# Altium footprint library Semicon-Discrete.pcblib: 205 footprints (part 3 of 13)
Each footprint in its own frame and in the unit in brackets; x right, y up, seen from the top. Pads: shape width x height; smd on the part's side, far side on the other; paste and mask are expansions set on the pad; w line width, h text height; cw(c..) or ccw(c..) is an arc to the next point about the centre after c.
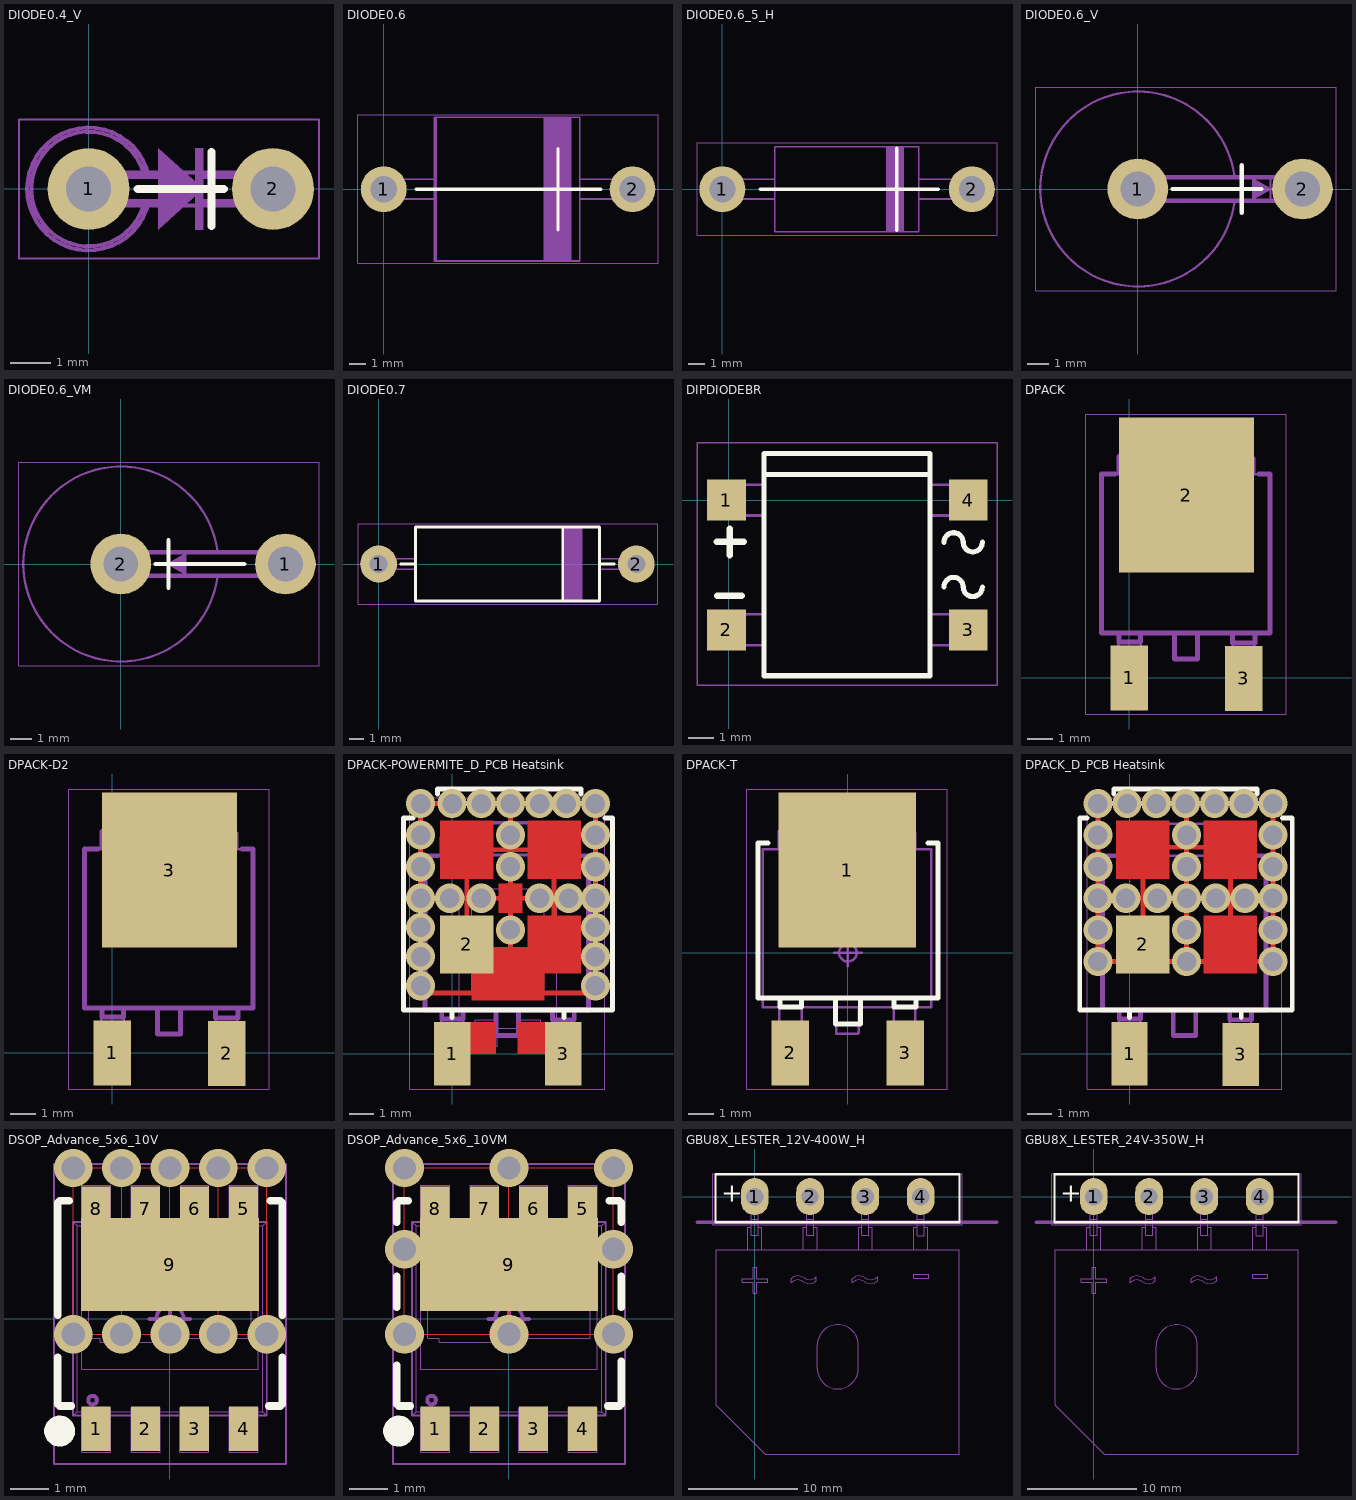
[diagram p2: the footprints below, top view; thin cyan lines are the x and y axes]

## DIODE0.4_V [mm]
pads (2):
  round 2 hole 1.1: 1(0,0) 2(4.5,0)
TopOverlay:
  lines w0.2: 1.2,0 3.3,0 ; 3,-0.9 3,0.9
2-TopCompOutl:
  lines w0.1: 1.338,-0.412 cw(c0,0) 1.338,0.412 ; 0,-0.4 4.5,-0.4 4.5,0.4 0,0.4 0,-0.4
4-TopCourty:
  circle w0.1: c0,0 r0.35
  lines w0.05: -1.7,-1.7 -1.7,1.7 5.625,1.7 5.625,-1.7 -1.7,-1.7
  lines w0.1: -0.525,0 0.525,0 ; 0,-0.525 0,0.525
7-TopAssy:
  rectangle: 2.6,-1 2.8,1
  region: 1.7,1 1.7,0 2.8,0
  region: 1.7,-1 1.7,0 2.8,0
  lines w0.1: 1.467,-0.314 cw(c0,0) 1.471,0.294 ; 1.7,-0.3 0,-0.3 cw(c0,0) 0,0.3 1.7,0.3 ; 2.8,-0.3 4.5,-0.3 ccw(c4.5,0) 4.5,0.3 2.8,0.3
  text ".Designator" at 1.175,1.275 h2.2

## DIODE0.6 [mm]
pads (2):
  round 2.8 hole 1.6: 1(0,0) 2(15.24,0)
TopOverlay:
  lines w0.2: 2,0 6.5,0 13.3,0 ; 10.675,-2.5 10.675,2.5
2-TopCompOutl:
  lines w0.1: 3.2,-0.6 0,-0.6 0,0.6 3.2,0.6 ; 10.8,-4.4 10.8,4.4 ; 12,-0.6 15.2,-0.6 15.2,0.6 12,0.6 ; 3.2,-4.4 3.2,4.4 12,4.4 12,-4.4 3.2,-4.4
4-TopCourty:
  circle w0.1: c0,0 r0.35
  lines w0.05: -1.575,-4.55 16.8,-4.55 16.8,4.575 -1.575,4.575 -1.575,-4.55
  lines w0.1: -0.525,0 0.525,0 ; 0,-0.525 0,0.525
7-TopAssy:
  rectangle: 9.8,-4.4 11.5,4.4
  lines w0.1: 3.1,-0.6 3.1,0.6 ; 3.1,-0.6 0,-0.6 0,0 0,0.6 3.1,0.6 ; 3.1,-0.6 3.1,-4.4 12,-4.4 12,-0.6 ; 3.1,0.6 3.1,4.4 12,4.4 12,0.6 ; 12,-0.6 12,0.6 ; 12,-0.6 15.3,-0.6 15.3,0 15.3,0.6 12,0.6
  text ".Designator" at 3.8,-0.5 h2.2
3D body "DIODE0.6.STEP": height 8.81, standoff -2.54, extent -0.55,-4.4 15.757,4.325

## DIODE0.6_5_H [mm]
height 5
pads (2):
  round 2.8 hole 1.6: 1(0,0) 2(15.24,0)
TopOverlay:
  lines w0.2: 2.3,0 13.2,0 ; 10.65,-2.5 10.65,2.5
2-TopCompOutl:
  lines w0.1: 3.2,-0.6 0,-0.6 0,0.6 3.2,0.6 ; 10.8,-2.6 10.8,2.6 ; 12,-0.6 15.2,-0.6 15.2,0.6 12,0.6 ; 3.2,-2.6 3.2,2.6 12,2.6 12,-2.6 3.2,-2.6
4-TopCourty:
  circle w0.1: c0,0 r0.35
  lines w0.05: -1.55,-2.8 -1.55,2.825 16.775,2.825 16.775,-2.8 -1.55,-2.8
  lines w0.1: -0.525,0 0.525,0 ; 0,-0.525 0,0.525
7-TopAssy:
  rectangle: 10,-2.6 11.1,2.6
  lines w0.1: 3.2,-0.6 0,-0.6 cw(c0,0) 0,0.6 3.2,0.6 ; 12,-0.6 15.2,-0.6 ccw(c15.2,0) 15.2,0.6 12,0.6 ; 3.2,-2.6 3.2,2.6 12,2.6 12,-2.6 3.2,-2.6
  text ".Designator" at 3.775,-0.525 h2.2

## DIODE0.6_V [mm]
pads (2):
  round 2.8 hole 1.6: 1(0,0) 2(7.6,0)
TopOverlay:
  lines w0.2: 1.6,0 5.7,0 ; 4.8,-1.1 4.8,1.1
2-TopCompOutl:
  lines w0.1: 4.472,-0.497 cw(c0,0) 4.472,0.497 ; 0,-0.5 7.6,-0.5 7.6,0.5 0,0.5 0,-0.5
4-TopCourty:
  circle w0.1: c0,0 r0.35
  lines w0.05: -4.7,-4.7 -4.7,4.7 9.15,4.7 9.15,-4.7 -4.7,-4.7
  lines w0.1: -0.525,0 0.525,0 ; 0,-0.525 0,0.525
7-TopAssy:
  region: 5.325,0.45 6.1,0 5.325,-0.45
  lines w0.1: 4.456,-0.626 cw(c0,0) 4.456,0.626 ; 4.5,0 6.575,0 ; 6.125,-0.475 6.125,0.475 ; 7.625,0.6 cw(c7.625,0) 7.625,-0.6 0,-0.6 cw(c0,0) 0,0.6 7.65,0.6 ; 5.325,-0.45 6.125,0 5.325,0.45 5.325,-0.45
  text ".Designator" at -2.55,1.4 h2.2

## DIODE0.6_VM [mm]
pads (2):
  round 2.8 hole 1.6: 1(7.6,0) 2(0,0)
TopOverlay:
  lines w0.2: 1.6,0 5.7,0 ; 2.2,-1.1 2.2,1.1
2-TopCompOutl:
  lines w0.1: 4.472,-0.497 cw(c0,0) 4.472,0.497 ; 0,-0.5 0,0.5 7.6,0.5 7.6,-0.5 0,-0.5
4-TopCourty:
  circle w0.1: c0,0 r0.35
  lines w0.05: -4.7,-4.7 9.15,-4.7 9.15,4.7 -4.7,4.7 -4.7,-4.7
  lines w0.1: -0.525,0 0.525,0 ; 0,-0.525 0,0.525
7-TopAssy:
  region: 2.975,-0.45 2.2,0 2.975,0.45
  lines w0.1: 1.725,0 3.8,0 ; 2.175,-0.475 2.175,0.475 ; 4.456,-0.626 cw(c0,0) 4.456,0.626 ; 7.625,0.6 cw(c7.625,0) 7.625,-0.6 0,-0.6 cw(c0,0) 0,0.6 7.65,0.6 ; 2.175,0 2.975,-0.45 2.975,0.45 2.175,0
  text ".Designator" at -2.4,1.575 h2.2

## DIODE0.7 [mm]
pads (2):
  round 2.54 hole 1.25: 1(0,0) 2(17.78,0)
TopOverlay:
  lines w0.2: 1.524,0 2.54,0 ; 12.7,-2.54 12.7,2.54 ; 15.24,0 16.256,0 ; 2.54,-2.54 2.54,2.54 15.24,2.54 15.24,-2.54 2.54,-2.54
4-TopCourty:
  circle w0.1: c0,0 r0.35
  lines w0.05: -1.425,-2.775 19.275,-2.775 19.275,2.775 -1.425,2.775 -1.425,-2.775
  lines w0.1: -0.525,0 0.525,0 ; 0,-0.525 0,0.525
7-TopAssy:
  rectangle: 12.8,-2.55 14.075,2.525
  lines w0.1: 2.55,-0.35 0,-0.35 cw(c0,0) 0,0.35 2.55,0.35 ; 15.225,-0.35 17.775,-0.35 ccw(c17.775,0) 17.775,0.35 15.225,0.35 ; 2.55,-2.525 15.225,-2.525 15.225,2.525 2.55,2.525 2.55,-2.525
  text ".Designator" at 3.05,-0.75 h2.2

## DIPDIODEBR [mm] "DIP,DiodeBridge"
height 3
pads (4):
  rect 1.52x1.6 smd: 1(-0.1,0) 2(-0.1,-5.08) 3(9.371,-5.08) 4(9.371,0)
TopOverlay:
  lines w0.2: 1.375,1 7.875,1 ; 8.425,-3.4 cw(c8.801,-3.4) 9.177,-3.4 ccw(c9.551,-3.4) 9.925,-3.4 ; 8.425,-1.65 cw(c8.801,-1.65) 9.177,-1.65 ccw(c9.551,-1.65) 9.925,-1.65 ; 1.375,-6.875 7.875,-6.875 7.875,1.825 1.375,1.825 1.375,-6.875
  lines w0.254: -0.475,-1.625 0.575,-1.625 ; -0.45,-3.75 0.5,-3.75 ; 0.025,-2.15 0.025,-1.125
2-TopCompOutl:
  lines w0.1: 1.375,-5.675 0,-5.675 0,-4.475 1.375,-4.475 ; 1.375,-0.6 0,-0.6 0,0.6 1.375,0.6 ; 1.375,1 7.87,1 ; 7.875,-5.675 9.25,-5.675 9.25,-4.475 7.875,-4.475 ; 7.875,-0.6 9.25,-0.6 9.25,0.6 7.875,0.6 ; 1.37,-6.9 7.875,-6.9 7.875,1.795 ccw(c7.87,1.795) 7.87,1.8 1.375,1.8 1.37,-6.9
4-TopCourty:
  circle w0.1: c0,0 r0.35
  lines w0.05: -1.25,-7.25 -1.25,2.25 10.5,2.25 10.5,-7.25 -1.25,-7.25
  lines w0.1: -0.525,0 0.525,0 ; 0,-0.525 0,0.525
7-TopAssy:
  lines w0.1: 1.375,-5.675 0,-5.675 0,-4.475 1.375,-4.475 ; 1.375,-0.6 0,-0.6 0,0.6 1.375,0.6 ; 1.375,1 7.87,1 ; 7.875,-5.675 9.25,-5.675 9.25,-4.475 7.875,-4.475 ; 7.875,-0.6 9.25,-0.6 9.25,0.6 7.875,0.6 ; 1.37,-6.9 7.875,-6.9 7.875,1.795 ccw(c7.87,1.795) 7.87,1.8 1.375,1.8 1.37,-6.9
  text ".Designator" at 5,-5.175 h2.2

## DPACK [mm]
pads (3):
  rect 1.5x2.6 smd: 1(0,0) 3(4.575,-0.025)
  rect 5.4x6.2 smd: 2(2.275,7.3)
2-TopCompOutl:
  lines w0.05: -0.5,8.15 -0.475,8.15 -0.475,8.85 0.15,9.475 4.3,9.475 5,8.775 5,8.15 ; -0.425,1.825 -0.45,1.825 -0.45,-0.5 0.45,-0.5 0.45,1.825 4.125,1.825 4.125,-0.5 5,-0.5 5,1.825 ; 1.825,1.825 1.825,0.775 1.85,0.75 2.675,0.75 2.725,0.8 2.725,1.825 ; -1.1,1.825 -1.1,8.15 5.625,8.15 5.625,1.825 -1.1,1.825
4-TopCourty:
  circle w0.05: c0,0 r0.3
  lines w0.05: -0.45,0 0.45,0 ; 0,-0.45 0,0.45 ; -1.75,-1.45 6.275,-1.45 6.275,10.55 5.55,10.55 -1.75,10.55 -1.75,-1.45
7-TopAssy:
  lines w0.1: -0.5,8.15 -0.475,8.15 -0.475,8.85 0.15,9.475 4.3,9.475 5,8.775 5,8.15 ; 1.825,1.825 1.825,0.775 1.85,0.75 2.675,0.75 2.725,0.8 2.725,1.825 ; 5,1.825 5,-0.5 4.125,-0.5 4.125,1.825 0.45,1.825 0.45,-0.5 -0.45,-0.5 -0.45,1.825 ; -0.45,1.825 -0.425,1.825 ; -0.45,1.825 -0.425,1.825 ; -0.45,1.825 -0.425,1.825 ; -1.1,1.825 5.625,1.825 5.625,8.15 -1.1,8.15 -1.1,1.825
  text ".Designator" at 0.575,3.75 h2.2
13-SMDTopOverlay:
  lines w0.2: -0.575,8.15 -1.11,8.15 -1.11,1.8 5.62,1.8 ; -0.45,1.8 -0.425,1.8 -0.425,1.425 0.45,1.425 0.45,1.8 ; -0.44,1.8 -0.43,1.8 ; 1.85,1.8 1.8,1.8 1.8,0.75 2.725,0.75 2.725,1.8 ; 4.1,1.8 4.125,1.8 4.125,1.4 5.025,1.4 5.025,1.8 ; 5.175,8.15 5.62,8.15 5.62,1.81 5.63,1.81
3D body "DPACK.STEP": height 2, standoff 0, extent -1.1,-0.3 5.625,9.675

## DPACK-D2 [mm]
pads (3):
  rect 1.5x2.6 smd: 1(0,0) 2(4.575,-0.025)
  rect 5.4x6.2 smd: 3(2.275,7.3)
2-TopCompOutl:
  lines w0.05: -0.5,8.15 -0.475,8.15 -0.475,8.85 0.15,9.475 4.3,9.475 5,8.775 5,8.15 ; -0.425,1.825 -0.45,1.825 -0.45,-0.5 0.45,-0.5 0.45,1.825 4.125,1.825 4.125,-0.5 5,-0.5 5,1.825 ; 1.825,1.825 1.825,0.775 1.85,0.75 2.675,0.75 2.725,0.8 2.725,1.825 ; -1.1,1.825 5.625,1.825 5.625,8.15 -1.1,8.15 -1.1,1.825
4-TopCourty:
  circle w0.1: c0,0 r0.35
  lines w0.05: -1.75,-1.45 -1.75,10.55 5.55,10.55 6.275,10.55 6.275,-1.45 -1.75,-1.45
  lines w0.1: -0.525,0 0.525,0 ; 0,-0.525 0,0.525
7-TopAssy:
  lines w0.1: -0.5,8.15 -0.475,8.15 -0.475,8.85 0.15,9.475 4.3,9.475 5,8.775 5,8.15 ; 1.825,1.825 1.825,0.775 1.85,0.75 2.675,0.75 2.725,0.8 2.725,1.825 ; 5,1.825 5,-0.5 4.125,-0.5 4.125,1.825 0.45,1.825 0.45,-0.5 -0.45,-0.5 -0.45,1.825 ; -0.45,1.825 -0.425,1.825 ; -0.45,1.825 -0.425,1.825 ; -0.45,1.825 -0.425,1.825 ; -1.1,1.825 5.625,1.825 5.625,8.15 -1.1,8.15 -1.1,1.825
  text ".Designator" at -0.45,2.675 h2.2
13-SMDTopOverlay:
  lines w0.2: -0.575,8.15 -1.11,8.15 -1.11,1.8 5.62,1.8 ; -0.45,1.8 -0.425,1.8 -0.425,1.425 0.45,1.425 0.45,1.8 ; -0.44,1.8 -0.43,1.8 ; 1.85,1.8 1.8,1.8 1.8,0.75 2.725,0.75 2.725,1.8 ; 4.1,1.8 4.125,1.8 4.125,1.4 5.025,1.4 5.025,1.8 ; 5.175,8.15 5.62,8.15 5.62,1.81 5.63,1.81

## DPACK-POWERMITE_D_PCB Heatsink [mm]
height 4
pads (3):
  rect 1.5x2.6 smd: 1(0,0) 3(4.575,0)
  rect 2.2x2.4 smd: 2(0.6,4.5)
via 5.9,10.3 diameter 1.2 hole 0.8
via 3.6,10.3 diameter 1.2 hole 0.8
via 4.7,10.3 diameter 1.2 hole 0.8
via 0,10.3 diameter 1.2 hole 0.8
via 1.2,10.3 diameter 1.2 hole 0.8
via 4.8,6.4 diameter 1.2 hole 0.8
via 3.6,6.4 diameter 1.2 hole 0.8
via 1.2,6.4 diameter 1.2 hole 0.8
via -0.1,6.4 diameter 1.2 hole 0.8
via 2.4,10.3 diameter 1.2 hole 0.8
via 2.4,9 diameter 1.2 hole 0.8
via 2.4,7.7 diameter 1.2 hole 0.8
via 2.4,5.1 diameter 1.2 hole 0.8
via 5.9,9 diameter 1.2 hole 0.8
via 5.9,7.7 diameter 1.2 hole 0.8
via 5.9,6.4 diameter 1.2 hole 0.8
via 5.9,5.2 diameter 1.2 hole 0.8
via 5.9,4 diameter 1.2 hole 0.8
via 5.9,2.8 diameter 1.2 hole 0.8
via -1.3,2.8 diameter 1.2 hole 0.8
via -1.3,4 diameter 1.2 hole 0.8
via -1.3,5.2 diameter 1.2 hole 0.8
via -1.3,6.4 diameter 1.2 hole 0.8
via -1.3,7.7 diameter 1.2 hole 0.8
via -1.3,9 diameter 1.2 hole 0.8
via -1.3,10.3 diameter 1.2 hole 0.8
TopLayer:
  region: 5.3,5.7 3.1,5.7 3.1,3.3 5.3,3.3
  region: 5.3,9.6 3.1,9.6 3.1,7.2 5.3,7.2
  region: 1.7,9.6 -0.5,9.6 -0.5,7.2 1.7,7.2
  region: 3.1,4.4 1.6,4.4 1.6,3.3 3.1,3.3
  region: 2.9,7 1.9,7 1.9,5.8 2.9,5.8
  region: 1.8,1.3 0.55,1.3 0.55,0 1.8,0
  region: 3.9,1.3 2.7,1.3 2.7,0 3.9,0
  region: 3.8,3.325 0.8,3.325 0.8,2.2 3.8,2.2
  lines w0.2: -1.3,6.4 5.9,6.4 ; 0.6,4.5 0.6,8.4 4.2,8.4 4.2,4.5 ; 2.4,10.3 2.4,5.1 2.4,2.5 ; 2.4,2.5 0.1,2.5 -1.3,2.5 -1.3,10.3 5.9,10.3 5.9,2.5 2.4,2.5
TopOverlay:
  lines w0.2: -1.6,9.7 -2,9.7 -2,1.8 6.6,1.8 6.6,9.7 6.3,9.7 ; -0.6,10.7 -0.6,10.9 5.3,10.9 5.3,10.7 ; 0,1.5 0,1.7 ; 4.6,1.5 4.6,1.7
TopPaste:
  region: 5.4,5.8 3,5.8 3,3.2 5.4,3.2
  region: 5.4,9.7 3,9.7 3,7.1 5.4,7.1
  region: 1.8,9.7 -0.6,9.7 -0.6,7.1 1.8,7.1
  region: 3.1,4.5 1.6,4.5 1.6,3.2 3.1,3.2
  region: 3,7.1 1.8,7.1 1.8,5.7 3,5.7
  region: 1.9,1.4 0.5,1.4 0.5,-0.1 1.9,-0.1
  region: 4,1.4 2.6,1.4 2.6,-0.1 4,-0.1
  region: 3.9,3.325 0.7,3.325 0.7,2.1 3.9,2.1
TopSolder:
  rectangle: 3,7.1 5.4,9.7
  rectangle: 3,3.2 5.4,5.8
  rectangle: -0.6,7.1 1.8,9.7
  rectangle: 1.7,3.2 3.2,4.5
  rectangle: 1.8,5.7 3,7.1
  rectangle: 0.5,-0.075 1.9,1.4
  rectangle: 2.6,-0.1 4.1,1.4
  rectangle: 0.7,2.1 3.9,3.325
2-TopCompOutl:
  lines w0.05: -0.5,8.15 -0.475,8.15 -0.475,8.85 0.15,9.475 4.3,9.475 5,8.775 5,8.15 ; -0.425,1.825 -0.45,1.825 -0.45,-0.5 0.45,-0.5 0.45,1.825 4.125,1.825 4.125,-0.5 5,-0.5 5,1.825 ; 0.95,1.05 0.95,0.3 1.85,0.3 1.85,1.05 ; 1.4,6.4 1.4,6.8 3.2,6.8 3.2,6.4 ; 1.825,1.825 1.825,0.775 1.85,0.75 2.675,0.75 2.725,0.8 2.725,1.825 ; 2.75,1.05 2.75,0.3 3.65,0.3 3.65,1.05 ; -1.1,1.825 5.625,1.825 5.625,8.15 -1.1,8.15 -1.1,1.825 ; 0.3,1.05 0.3,6.4 4.3,6.4 4.3,1.05 0.3,1.05
4-TopCourty:
  circle w0.1: c0,0 r0.35
  lines w0.05: -1.75,-1.45 -1.75,10.55 5.55,10.55 6.275,10.55 6.275,-1.45 -1.75,-1.45
  lines w0.1: -0.525,0 0.525,0 ; 0,-0.525 0,0.525
5-MCadOutl:
  lines w0.05: 0.8,2.45 0.8,6 1.4,6 1.4,6.8 3.2,6.8 3.2,6 3.8,6 3.8,2.45 2.3,2.45 0.8,2.45 ; 0.95,0.3 0.95,1.4 1.85,1.4 1.85,0.3 0.95,0.3 ; 2.75,0.3 3.65,0.3 3.65,1.4 2.75,1.4 2.75,0.3
7-TopAssy:
  lines w0.1: -0.5,8.2 -0.475,8.2 -0.475,8.9 0.15,9.525 4.3,9.525 5,8.825 5,8.2 ; 1.825,1.875 1.825,0.825 1.85,0.8 2.675,0.8 2.725,0.85 2.725,1.875 ; 5,1.875 5,-0.45 4.125,-0.45 4.125,1.875 0.45,1.875 0.45,-0.45 -0.45,-0.45 -0.45,1.875 ; -0.45,1.875 -0.425,1.875 ; -0.45,1.875 -0.425,1.875 ; -0.45,1.875 -0.425,1.875 ; -1.1,1.875 5.625,1.875 5.625,8.2 -1.1,8.2 -1.1,1.875
  text ".Designator" at -0.15,3.35 h2.2
13-SMDTopOverlay:
  lines w0.2: -0.575,8.15 -1.11,8.15 -1.11,1.8 5.62,1.8 ; -0.45,1.8 -0.425,1.8 -0.425,1.425 0.45,1.425 0.45,1.8 ; -0.44,1.8 -0.43,1.8 ; 1.85,1.8 1.8,1.8 1.8,0.75 2.725,0.75 2.725,1.8 ; 4.1,1.8 4.125,1.8 4.125,1.4 5.025,1.4 5.025,1.8 ; 5.175,8.15 5.62,8.15 5.62,1.81 5.63,1.81

## DPACK-T [mm]
pads (3):
  rect 5.5x6.2 smd: 1(-0.025,3.3)
  rect 1.5x2.6 smd: 2(-2.3,-4) 3(2.3,-4)
TopOverlay:
  lines w0.2: -3.2,4.4 -3.6,4.4 -3.6,-1.8 0,-1.8 3.6,-1.8 3.6,4.4 3.2,4.4 ; -2.725,-1.8 -2.725,-2.175 -1.85,-2.175 -1.85,-1.8 ; -0.45,-1.8 -0.5,-1.8 -0.5,-2.85 0,-2.85 0.5,-2.85 0.5,-1.8 0.45,-1.8 ; 1.85,-1.8 1.85,-2.175 2.725,-2.175 2.725,-1.8
2-TopCompOutl:
  lines w0.05: -2.8,4.15 -2.775,4.15 -2.775,4.85 -2.15,5.475 2,5.475 2.7,4.775 2.7,4.15 ; -2.725,-2.175 -2.75,-2.175 -2.75,-4.5 -1.85,-4.5 -1.85,-2.175 1.825,-2.175 1.825,-4.5 2.7,-4.5 2.7,-2.175 ; -0.475,-2.175 -0.475,-3.225 -0.45,-3.25 0.375,-3.25 0.425,-3.2 0.425,-2.175 ; -3.4,-2.175 -3.4,4.15 3.325,4.15 3.325,-2.175 -3.4,-2.175
4-TopCourty:
  circle w0.1: c0,0 r0.35
  lines w0.05: -4.05,-5.45 -4.05,6.55 3.25,6.55 3.975,6.55 3.975,-5.45 -4.05,-5.45
  lines w0.1: -0.55,0 0.55,0 ; 0,-0.55 0,0.55
7-TopAssy:
  lines w0.1: -2.8,4.15 -2.775,4.15 -2.775,4.85 -2.15,5.475 2,5.475 2.7,4.775 2.7,4.15 ; -0.475,-2.175 -0.475,-3.225 -0.45,-3.25 0.375,-3.25 0.425,-3.2 0.425,-2.175 ; 2.7,-2.175 2.7,-4.5 1.825,-4.5 1.825,-2.175 -1.85,-2.175 -1.85,-4.5 -2.75,-4.5 -2.75,-2.175 ; -2.75,-2.175 -2.725,-2.175 ; -2.75,-2.175 -2.725,-2.175 ; -2.75,-2.175 -2.725,-2.175 ; -3.4,-2.175 -3.4,4.15 3.325,4.15 3.325,-2.175 -3.4,-2.175
  text ".Designator" at -2.5,-0.3 h2
3D body "DPACK-T.STEP": height 2, standoff 0, extent -3.4,-4.7 3.35,5.275

## DPACK_D_PCB Heatsink [mm]
height 4
pads (3):
  rect 1.5x2.6 smd: 1(0,0) 3(4.575,-0.025)
  rect 2.2x2.4 smd: 2(0.55,4.5)
via -1.3,10.3 diameter 1.2 hole 0.8
via -1.3,9 diameter 1.2 hole 0.8
via -1.3,7.7 diameter 1.2 hole 0.8
via -1.3,6.4 diameter 1.2 hole 0.8
via -1.3,5.1 diameter 1.2 hole 0.8
via -1.3,3.8 diameter 1.2 hole 0.8
via 5.9,3.8 diameter 1.2 hole 0.8
via 5.9,5.1 diameter 1.2 hole 0.8
via 5.9,6.4 diameter 1.2 hole 0.8
via 5.9,7.7 diameter 1.2 hole 0.8
via 5.9,9 diameter 1.2 hole 0.8
via 2.35,3.8 diameter 1.2 hole 0.8
via 2.35,5.1 diameter 1.2 hole 0.8
via 2.35,6.4 diameter 1.2 hole 0.8
via 2.35,7.7 diameter 1.2 hole 0.8
via 2.35,9 diameter 1.2 hole 0.8
via 2.3,10.3 diameter 1.2 hole 0.8
via -0.15,6.4 diameter 1.2 hole 0.8
via 1.15,6.4 diameter 1.2 hole 0.8
via 3.55,6.4 diameter 1.2 hole 0.8
via 4.75,6.4 diameter 1.2 hole 0.8
via 1.1,10.3 diameter 1.2 hole 0.8
via -0.1,10.3 diameter 1.2 hole 0.8
via 4.7,10.3 diameter 1.2 hole 0.8
via 3.5,10.3 diameter 1.2 hole 0.8
via 5.9,10.3 diameter 1.2 hole 0.8
TopLayer:
  region: 1.65,9.6 -0.55,9.6 -0.55,7.2 1.65,7.2
  region: 5.25,9.6 3.05,9.6 3.05,7.2 5.25,7.2
  region: 5.25,5.7 3.05,5.7 3.05,3.3 5.25,3.3
  lines w0.2: -1.3,6.4 5.9,6.4 ; 0.55,4.5 0.55,8.5 4.15,8.5 4.15,3.8 ; 2.35,3.8 2.35,10.3 ; -1.3,3.8 5.9,3.8 5.9,10.3 -1.3,10.3 -1.3,4.5 -1.3,3.8
TopOverlay:
  lines w0.2: -1.75,9.7 -2.05,9.7 -2.05,1.8 6.7,1.8 6.7,9.7 6.3,9.7 ; -0.65,10.7 -0.65,10.9 5.25,10.9 5.25,10.7 ; 0,1.5 0,1.7 ; 4.6,1.5 4.6,1.7
TopPaste:
  region: 1.75,9.7 -0.65,9.7 -0.65,7.1 1.75,7.1
  region: 5.35,9.7 2.95,9.7 2.95,7.1 5.35,7.1
  region: 5.35,5.8 2.95,5.8 2.95,3.2 5.35,3.2
TopSolder:
  rectangle: -0.65,7.1 1.65,9.7
  rectangle: 2.95,7.1 5.25,9.7
  rectangle: 2.95,3.2 5.25,5.8
2-TopCompOutl:
  lines w0.05: -0.55,8.15 -0.525,8.15 -0.525,8.85 0.1,9.475 4.25,9.475 4.95,8.775 4.95,8.15 ; -0.425,1.825 -0.45,1.825 -0.45,-0.5 0.45,-0.5 0.45,1.825 4.125,1.825 4.125,-0.5 5,-0.5 5,1.825 ; 1.825,1.825 1.825,0.775 1.85,0.75 2.675,0.75 2.725,0.8 2.725,1.825 ; -1.1,1.825 -1.1,8.15 5.625,8.15 5.625,1.825 -1.1,1.825
4-TopCourty:
  circle w0.1: c0,0 r0.35
  lines w0.05: -1.75,-1.45 6.275,-1.45 6.275,10.55 5.55,10.55 -1.75,10.55 -1.75,-1.45
  lines w0.1: -0.525,0 0.525,0 ; 0,-0.525 0,0.525
7-TopAssy:
  lines w0.1: -0.5,8.15 -0.475,8.15 -0.475,8.85 0.15,9.475 4.3,9.475 5,8.775 5,8.15 ; 1.825,1.825 1.825,0.775 1.85,0.75 2.675,0.75 2.725,0.8 2.725,1.825 ; 5,1.825 5,-0.5 4.125,-0.5 4.125,1.825 0.45,1.825 0.45,-0.5 -0.45,-0.5 -0.45,1.825 ; -0.45,1.825 -0.425,1.825 ; -0.45,1.825 -0.425,1.825 ; -0.45,1.825 -0.425,1.825 ; -1.1,1.825 5.625,1.825 5.625,8.15 -1.1,8.15 -1.1,1.825
  text ".Designator" at -0.325,3.325 h2.2
13-SMDTopOverlay:
  lines w0.2: -0.575,8.15 -1.11,8.15 -1.11,1.8 5.62,1.8 ; -0.45,1.8 -0.425,1.8 -0.425,1.425 0.45,1.425 0.45,1.8 ; -0.44,1.8 -0.43,1.8 ; 1.85,1.8 1.8,1.8 1.8,0.75 2.725,0.75 2.725,1.8 ; 4.1,1.8 4.125,1.8 4.125,1.4 5.025,1.4 5.025,1.8 ; 5.175,8.15 5.62,8.15 5.62,1.81 5.63,1.81

## DSOP_Advance_5x6_10V [mm] "DSOP Advance - Toshiba Exposed Top Pad (5 x 6mm)"
height 0.75
pads (9):
  rect 0.75x1.15 smd: 1(-1.905,-2.845) 2(-0.635,-2.845) 3(0.635,-2.845) 4(1.905,-2.845) 5(1.905,2.845) 6(0.635,2.845) 7(-0.635,2.845) 8(-1.905,2.845)
  rect 4.6x2.4 smd: 9(0,1.4)
via -2.5,3.9 diameter 1 hole 0.6
via -2.5,-0.4 diameter 1 hole 0.6
via -1.25,-0.4 diameter 1 hole 0.6
via 1.25,-0.4 diameter 1 hole 0.6
via 2.5,-0.4 diameter 1 hole 0.6
via 1.25,3.9 diameter 1 hole 0.6
via -1.25,3.9 diameter 1 hole 0.6
via 2.5,3.9 diameter 1 hole 0.6
via 0,3.9 diameter 1 hole 0.6
via 0,-0.4 diameter 1 hole 0.6
TopLayer:
  lines w0.02: -1.25,-0.4 -1.25,3.9 ; 0,-0.4 0,3.9 ; 1.25,-0.4 1.25,3.9 ; -2.5,-0.4 -2.5,3.9 2.5,3.9 2.5,-0.4 -2.5,-0.4
TopOverlay:
  circle w0.4: c-2.85,-2.9 r0.2
  lines w0.2: -2.9,-1 -2.9,-2.2 -2.85,-2.25 -2.55,-2.25 ; -2.9,0.1 -2.9,3 -2.85,3.05 -2.6,3.05 ; 2.55,-2.25 2.85,-2.25 2.9,-2.2 2.9,-1 ; 2.6,3.05 2.85,3.05 2.9,3 2.9,0.1
2-TopCompOutl:
  circle w0.1: c-2,-2.1 r0.112
  lines w0.02: -2.5,-2.5 -2.4,-2.4 ; -2.5,2.5 -2.4,2.4 ; -2.105,-2.515 -2.105,-2.915 -1.705,-2.915 -1.705,-2.515 ; -2.105,2.515 -2.105,2.915 -1.705,2.915 -1.705,2.515 ; -0.835,-2.515 -0.835,-2.915 -0.435,-2.915 -0.435,-2.515 ; -0.835,2.515 -0.835,2.915 -0.435,2.915 -0.435,2.515 ; 0.435,-2.515 0.435,-2.915 0.835,-2.915 0.835,-2.515 ; 0.435,2.515 0.435,2.915 0.835,2.915 0.835,2.515 ; 1.705,-2.515 1.705,-2.915 2.105,-2.915 2.105,-2.515 ; 1.705,2.515 1.705,2.915 2.105,2.915 2.105,2.515 ; 2.5,-2.5 2.4,-2.4 ; 2.5,2.5 2.4,2.4 ; -2.4,-2.4 -2.4,0 -2.4,2.4 ; -2.4,-2.4 0,-2.4 2.4,-2.4 ; -2.4,2.4 0,2.4 2.4,2.4 ; 2.4,-2.4 2.4,0 2.4,2.4 ; -2.1,-0.5 -2.1,2 2.1,2 2.1,-0.5 0.3,-0.5 0.3,-0.6 -1.8,-0.6 -1.8,-0.5 -2.1,-0.5
  lines w0.05: -2.5,-2.5 0,-2.5 2.5,-2.5 2.5,0 2.5,2.5 0,2.5 -2.5,2.5 -2.5,0 -2.5,-2.5
4-TopCourty:
  circle w0.1: c0,0 r0.35
  lines w0.05: -3,-3.75 3,-3.75 3,4 -3,4 -3,-3.75
  lines w0.1: -0.525,0 0.525,0 ; 0,-0.525 0,0.525
5-MCadOutl:
  lines w0.02: -2.275,-3.45 -2.275,-2.3 -1.525,-2.3 -1.525,-3.45 -2.275,-3.45 ; -2.275,-1.3 -2.275,0 -2.275,3.45 -1.525,3.45 -1.525,2.45 -1,2.45 -1,3.45 -0.275,3.45 -0.275,2.45 0,2.45 0.275,2.45 0.275,3.45 1,3.45 1,2.45 1.525,2.45 1.525,3.45 2.275,3.45 2.275,0 2.275,-1.3 0,-1.3 -2.275,-1.3 ; -1.005,-3.45 -0.255,-3.45 -0.255,-2.3 -1.005,-2.3 -1.005,-3.45 ; 0.255,-3.45 0.255,-2.3 1.005,-2.3 1.005,-3.45 0.255,-3.45 ; 1.525,-3.45 2.275,-3.45 2.275,-2.3 1.525,-2.3 1.525,-3.45
7-TopAssy:
  circle w0.1: c-2,-2.1 r0.112
  lines w0.02: -2.5,-2.5 -2.4,-2.4 ; -2.5,2.5 -2.4,2.4 ; -2.105,-2.515 -2.105,-2.915 -1.705,-2.915 -1.705,-2.515 ; -2.105,2.515 -2.105,2.915 -1.705,2.915 -1.705,2.515 ; -0.835,-2.515 -0.835,-2.915 -0.435,-2.915 -0.435,-2.515 ; -0.835,2.515 -0.835,2.915 -0.435,2.915 -0.435,2.515 ; 0.435,-2.515 0.435,-2.915 0.835,-2.915 0.835,-2.515 ; 0.435,2.515 0.435,2.915 0.835,2.915 0.835,2.515 ; 1.705,-2.515 1.705,-2.915 2.105,-2.915 2.105,-2.515 ; 1.705,2.515 1.705,2.915 2.105,2.915 2.105,2.515 ; 2.5,-2.5 2.4,-2.4 ; 2.5,2.5 2.4,2.4 ; -2.4,-2.4 0,-2.4 2.4,-2.4 ; -2.4,-2.4 -2.4,0 -2.4,2.4 ; -2.4,2.4 0,2.4 2.4,2.4 ; 2.4,-2.4 2.4,0 2.4,2.4 ; -2.1,-0.5 -1.8,-0.5 -1.8,-0.6 0.3,-0.6 0.3,-0.5 2.1,-0.5 2.1,2 -2.1,2 -2.1,-0.5
  lines w0.05: -2.5,-2.5 -2.5,0 -2.5,2.5 0,2.5 2.5,2.5 2.5,0 2.5,-2.5 0,-2.5 -2.5,-2.5
  text ".Designator" at -2,-0.3 h2.2
3D body "DSOP_Advance_5x6.STEP": height 0.75, standoff 0, extent -2.65,-3 2.65,3

## DSOP_Advance_5x6_10VM [mm] "DSOP Advance - Toshiba Exposed Top Pad (5 x 6mm)"
height 0.75
pads (9):
  rect 0.75x1.15 smd: 1(-1.905,-2.845) 2(-0.635,-2.845) 3(0.635,-2.845) 4(1.905,-2.845) 5(1.905,2.845) 6(0.635,2.845) 7(-0.635,2.845) 8(-1.905,2.845)
  rect 4.6x2.4 smd: 9(0,1.4)
via -2.7,-0.4 diameter 1 hole 0.6
via 2.7,1.8 diameter 1 hole 0.6
via -2.7,1.8 diameter 1 hole 0.6
via -2.7,3.9 diameter 1 hole 0.6
via 2.7,-0.4 diameter 1 hole 0.6
via 2.7,3.9 diameter 1 hole 0.6
via 0,3.9 diameter 1 hole 0.6
via 0,-0.4 diameter 1 hole 0.6
TopLayer:
  lines w0.02: 0,-0.4 0,3.9 ; -2.7,-0.4 -2.7,3.9 2.7,3.9 2.7,-0.4 -2.7,-0.4
TopOverlay:
  circle w0.4: c-2.85,-2.9 r0.2
  lines w0.2: -2.9,-1.2 -2.9,-2.2 -2.85,-2.25 -2.55,-2.25 ; -2.9,0.3 -2.9,1.1 ; -2.9,2.5 -2.9,3 -2.85,3.05 -2.6,3.05 ; 2.55,-2.25 2.85,-2.25 2.9,-2.2 2.9,-1.1 ; 2.6,3.05 2.85,3.05 2.9,3 2.9,2.5 ; 2.9,0.3 2.9,1.1
2-TopCompOutl:
  circle w0.1: c-2,-2.1 r0.112
  lines w0.02: -2.5,-2.5 -2.4,-2.4 ; -2.5,2.5 -2.4,2.4 ; -2.105,-2.515 -2.105,-2.915 -1.705,-2.915 -1.705,-2.515 ; -2.105,2.515 -2.105,2.915 -1.705,2.915 -1.705,2.515 ; -0.835,-2.515 -0.835,-2.915 -0.435,-2.915 -0.435,-2.515 ; -0.835,2.515 -0.835,2.915 -0.435,2.915 -0.435,2.515 ; 0.435,-2.515 0.435,-2.915 0.835,-2.915 0.835,-2.515 ; 0.435,2.515 0.435,2.915 0.835,2.915 0.835,2.515 ; 1.705,-2.515 1.705,-2.915 2.105,-2.915 2.105,-2.515 ; 1.705,2.515 1.705,2.915 2.105,2.915 2.105,2.515 ; 2.5,-2.5 2.4,-2.4 ; 2.5,2.5 2.4,2.4 ; -2.4,-2.4 -2.4,0 -2.4,2.4 ; -2.4,-2.4 0,-2.4 2.4,-2.4 ; -2.4,2.4 0,2.4 2.4,2.4 ; 2.4,-2.4 2.4,0 2.4,2.4 ; -2.1,-0.5 -2.1,2 2.1,2 2.1,-0.5 0.3,-0.5 0.3,-0.6 -1.8,-0.6 -1.8,-0.5 -2.1,-0.5
  lines w0.05: -2.5,-2.5 0,-2.5 2.5,-2.5 2.5,0 2.5,2.5 0,2.5 -2.5,2.5 -2.5,0 -2.5,-2.5
4-TopCourty:
  circle w0.1: c0,0 r0.35
  lines w0.05: -3,-3.75 3,-3.75 3,4 -3,4 -3,-3.75
  lines w0.1: -0.525,0 0.525,0 ; 0,-0.525 0,0.525
5-MCadOutl:
  lines w0.02: -2.275,-3.45 -2.275,-2.3 -1.525,-2.3 -1.525,-3.45 -2.275,-3.45 ; -2.275,-1.3 -2.275,0 -2.275,3.45 -1.525,3.45 -1.525,2.45 -1,2.45 -1,3.45 -0.275,3.45 -0.275,2.45 0,2.45 0.275,2.45 0.275,3.45 1,3.45 1,2.45 1.525,2.45 1.525,3.45 2.275,3.45 2.275,0 2.275,-1.3 0,-1.3 -2.275,-1.3 ; -1.005,-3.45 -0.255,-3.45 -0.255,-2.3 -1.005,-2.3 -1.005,-3.45 ; 0.255,-3.45 0.255,-2.3 1.005,-2.3 1.005,-3.45 0.255,-3.45 ; 1.525,-3.45 2.275,-3.45 2.275,-2.3 1.525,-2.3 1.525,-3.45
7-TopAssy:
  circle w0.1: c-2,-2.1 r0.112
  lines w0.02: -2.5,-2.5 -2.4,-2.4 ; -2.5,2.5 -2.4,2.4 ; -2.105,-2.515 -2.105,-2.915 -1.705,-2.915 -1.705,-2.515 ; -2.105,2.515 -2.105,2.915 -1.705,2.915 -1.705,2.515 ; -0.835,-2.515 -0.835,-2.915 -0.435,-2.915 -0.435,-2.515 ; -0.835,2.515 -0.835,2.915 -0.435,2.915 -0.435,2.515 ; 0.435,-2.515 0.435,-2.915 0.835,-2.915 0.835,-2.515 ; 0.435,2.515 0.435,2.915 0.835,2.915 0.835,2.515 ; 1.705,-2.515 1.705,-2.915 2.105,-2.915 2.105,-2.515 ; 1.705,2.515 1.705,2.915 2.105,2.915 2.105,2.515 ; 2.5,-2.5 2.4,-2.4 ; 2.5,2.5 2.4,2.4 ; -2.4,-2.4 0,-2.4 2.4,-2.4 ; -2.4,-2.4 -2.4,0 -2.4,2.4 ; -2.4,2.4 0,2.4 2.4,2.4 ; 2.4,-2.4 2.4,0 2.4,2.4 ; -2.1,-0.5 -1.8,-0.5 -1.8,-0.6 0.3,-0.6 0.3,-0.5 2.1,-0.5 2.1,2 -2.1,2 -2.1,-0.5
  lines w0.05: -2.5,-2.5 -2.5,0 -2.5,2.5 0,2.5 2.5,2.5 2.5,0 2.5,-2.5 0,-2.5 -2.5,-2.5
  text ".Designator" at -2,-0.3 h2.2
3D body "DSOP_Advance_5x6.STEP": height 0.75, standoff 0, extent -2.65,-3 2.65,3

## GBU8X_LESTER_12V-400W_H [mm]
height 20
pads (4):
  oval 2.55x3.4 hole 1.6: 1(0,0) 2(5.08,0) 3(10.16,0) 4(15.24,0)
TopOverlay:
  lines w0.2: -3.6,-2.35 18.8,-2.35 18.8,2.05 -3.6,2.05 -3.6,-2.35
  text "+" at -3.075,-1.075 h3
2-TopCompOutl:
  lines w0.1: -0.626,-4.856 -0.626,-2.806 -0.309,-2.806 ; -0.309,-3.561 0.326,-3.561 ; -0.309,-3.556 -0.309,-2.056 0.326,-2.056 0.326,-3.556 ; -0.309,-3.336 -0.309,-2.306 ; -0.309,-3.056 -0.309,-2.586 0.326,-2.586 0.326,-3.056 ; 0.326,-3.336 0.326,-2.306 ; 0.326,-2.806 0.644,-2.806 0.644,-4.856 ; 4.454,-4.856 4.454,-2.806 4.771,-2.806 ; 4.766,-3.561 5.401,-3.561 ; 4.771,-3.556 4.771,-2.056 5.406,-2.056 5.406,-3.556 ; 4.771,-3.336 4.771,-2.306 ; 4.771,-3.056 4.771,-2.586 5.406,-2.586 5.406,-3.056 ; 5.406,-3.336 5.406,-2.306 ; 5.406,-2.806 5.724,-2.806 5.724,-4.856 ; 9.534,-4.856 9.534,-2.806 9.851,-2.806 ; 9.851,-3.556 9.851,-2.056 10.486,-2.056 10.486,-3.556 ; 9.851,-3.336 9.851,-2.306 ; 9.851,-3.056 9.851,-2.586 10.486,-2.586 10.486,-3.056 ; 9.866,-3.561 10.501,-3.561 ; 10.486,-3.336 10.486,-2.306 ; 10.486,-2.806 10.804,-2.806 10.804,-4.856 ; 14.614,-4.856 14.614,-2.806 14.931,-2.806 ; 14.931,-3.556 14.931,-2.056 15.566,-2.056 15.566,-3.556 ; 14.931,-3.336 14.931,-2.306 ; 14.931,-3.056 14.931,-2.586 15.566,-2.586 15.566,-3.056 ; 14.941,-3.586 15.576,-3.586 ; 15.566,-3.336 15.566,-2.306 ; 15.566,-2.806 15.884,-2.806 15.884,-4.856 ; -0.309,-2.306 0.326,-2.306 ; -0.309,-2.306 -0.309,-0.663 ; -0.309,-0.663 0.326,-0.663 ; -0.309,-0.663 -0.309,0.367 0.326,0.367 0.326,-0.663 ; 0.326,-2.306 0.326,-0.663 ; 4.771,-2.306 5.406,-2.306 ; 4.771,-2.306 4.771,-0.663 ; 4.771,-0.663 5.406,-0.663 ; 4.771,-0.663 4.771,0.367 5.406,0.367 5.406,-0.663 ; 5.406,-2.306 5.406,-0.663 ; 9.851,-2.306 9.851,-0.663 ; 9.851,-2.306 10.486,-2.306 ; 9.851,-0.663 9.851,0.367 10.486,0.367 10.486,-0.663 ; 9.851,-0.663 10.486,-0.663 ; 10.486,-2.306 10.486,-0.663 ; 14.931,-2.306 14.931,-0.663 ; 14.931,-2.306 15.566,-2.306 ; 14.931,-0.663 14.931,0.367 15.566,0.367 15.566,-0.663 ; 14.931,-0.663 15.566,-0.663 ; 15.566,-2.306 15.566,-0.663 ; -3.521,-19.156 0.979,-23.656 18.779,-23.656 18.779,-4.856 -3.521,-4.856 -3.521,-19.156 ; -1.162,-7.84 -0.13,-7.84 -0.13,-8.872 0.184,-8.872 0.184,-7.84 1.216,-7.84 1.216,-7.526 0.184,-7.526 0.184,-6.494 -0.13,-6.494 -0.13,-7.526 -1.162,-7.526 -1.162,-7.84 ; 3.34,-7.908 cw(c4.106,-8.8) 3.924,-7.638 cw(c3.795,-8.955) 4.475,-7.82 ccw(c5.229,-6.36) 5.09,-7.997 ccw(c4.917,-6.856) 5.674,-7.728 5.674,-7.369 cw(c4.909,-6.468) 5.072,-7.638 cw(c5.254,-6.218) 4.527,-7.452 ccw(c3.781,-8.925) 3.919,-7.279 ccw(c4.034,-8.283) 3.34,-7.549 3.34,-7.908 ; 5.729,-15.756 ccw(c7.629,-15.756) 9.529,-15.756 9.529,-13.656 ccw(c7.629,-13.656) 5.729,-13.656 5.729,-15.756 ; 8.949,-7.908 cw(c9.715,-8.8) 9.533,-7.638 cw(c9.404,-8.955) 10.084,-7.82 ccw(c10.838,-6.36) 10.699,-7.997 ccw(c10.526,-6.856) 11.283,-7.728 11.283,-7.369 cw(c10.518,-6.468) 10.681,-7.638 cw(c10.863,-6.218) 10.136,-7.452 ccw(c9.39,-8.925) 9.528,-7.279 ccw(c9.643,-8.283) 8.949,-7.549 8.949,-7.908 ; 14.619,-7.481 15.965,-7.481 15.965,-7.122 14.619,-7.122 14.619,-7.481
4-TopCourty:
  circle w0.1: c-0.1,-0.05 r0.35
  lines w0.05: -3.85,-2.6 -3.85,2.1 19.05,2.1 19.05,-2.6 -3.85,-2.6
  lines w0.1: -0.625,-0.05 0.425,-0.05 ; -0.1,-0.575 -0.1,0.475
5-MCadOutl:
  lines w0.3: -5.3,-2.35 22.25,-2.35
  text "PCB EDGE" at 1.15,-4.3 h2
7-TopAssy:
  lines w0.1: -0.626,-4.856 -0.626,-2.806 -0.309,-2.806 ; -0.309,-3.561 0.326,-3.561 ; -0.309,-3.556 -0.309,-2.056 0.326,-2.056 0.326,-3.556 ; -0.309,-3.336 -0.309,-2.306 ; -0.309,-3.056 -0.309,-2.586 0.326,-2.586 0.326,-3.056 ; 0.326,-3.336 0.326,-2.306 ; 0.326,-2.806 0.644,-2.806 0.644,-4.856 ; 4.454,-4.856 4.454,-2.806 4.771,-2.806 ; 4.766,-3.561 5.401,-3.561 ; 4.771,-3.556 4.771,-2.056 5.406,-2.056 5.406,-3.556 ; 4.771,-3.336 4.771,-2.306 ; 4.771,-3.056 4.771,-2.586 5.406,-2.586 5.406,-3.056 ; 5.406,-3.336 5.406,-2.306 ; 5.406,-2.806 5.724,-2.806 5.724,-4.856 ; 9.534,-4.856 9.534,-2.806 9.851,-2.806 ; 9.851,-3.556 9.851,-2.056 10.486,-2.056 10.486,-3.556 ; 9.851,-3.336 9.851,-2.306 ; 9.851,-3.056 9.851,-2.586 10.486,-2.586 10.486,-3.056 ; 9.866,-3.561 10.501,-3.561 ; 10.486,-3.336 10.486,-2.306 ; 10.486,-2.806 10.804,-2.806 10.804,-4.856 ; 14.614,-4.856 14.614,-2.806 14.931,-2.806 ; 14.931,-3.556 14.931,-2.056 15.566,-2.056 15.566,-3.556 ; 14.931,-3.336 14.931,-2.306 ; 14.931,-3.056 14.931,-2.586 15.566,-2.586 15.566,-3.056 ; 14.941,-3.586 15.576,-3.586 ; 15.566,-3.336 15.566,-2.306 ; 15.566,-2.806 15.884,-2.806 15.884,-4.856 ; -0.309,-2.306 0.326,-2.306 ; -0.309,-2.306 -0.309,-0.663 ; -0.309,-0.663 0.326,-0.663 ; -0.309,-0.663 -0.309,0.367 0.326,0.367 0.326,-0.663 ; 0.326,-2.306 0.326,-0.663 ; 4.771,-2.306 5.406,-2.306 ; 4.771,-2.306 4.771,-0.663 ; 4.771,-0.663 5.406,-0.663 ; 4.771,-0.663 4.771,0.367 5.406,0.367 5.406,-0.663 ; 5.406,-2.306 5.406,-0.663 ; 9.851,-2.306 9.851,-0.663 ; 9.851,-2.306 10.486,-2.306 ; 9.851,-0.663 9.851,0.367 10.486,0.367 10.486,-0.663 ; 9.851,-0.663 10.486,-0.663 ; 10.486,-2.306 10.486,-0.663 ; 14.931,-2.306 14.931,-0.663 ; 14.931,-2.306 15.566,-2.306 ; 14.931,-0.663 14.931,0.367 15.566,0.367 15.566,-0.663 ; 14.931,-0.663 15.566,-0.663 ; 15.566,-2.306 15.566,-0.663 ; -3.521,-19.156 0.979,-23.656 18.779,-23.656 18.779,-4.856 -3.521,-4.856 -3.521,-19.156 ; -1.162,-7.84 -0.13,-7.84 -0.13,-8.872 0.184,-8.872 0.184,-7.84 1.216,-7.84 1.216,-7.526 0.184,-7.526 0.184,-6.494 -0.13,-6.494 -0.13,-7.526 -1.162,-7.526 -1.162,-7.84 ; 3.34,-7.908 cw(c4.106,-8.8) 3.924,-7.638 cw(c3.795,-8.955) 4.475,-7.82 ccw(c5.229,-6.36) 5.09,-7.997 ccw(c4.917,-6.856) 5.674,-7.728 5.674,-7.369 cw(c4.909,-6.468) 5.072,-7.638 cw(c5.254,-6.218) 4.527,-7.452 ccw(c3.781,-8.925) 3.919,-7.279 ccw(c4.034,-8.283) 3.34,-7.549 3.34,-7.908 ; 5.729,-15.756 ccw(c7.629,-15.756) 9.529,-15.756 9.529,-13.656 ccw(c7.629,-13.656) 5.729,-13.656 5.729,-15.756 ; 8.949,-7.908 cw(c9.715,-8.8) 9.533,-7.638 cw(c9.404,-8.955) 10.084,-7.82 ccw(c10.838,-6.36) 10.699,-7.997 ccw(c10.526,-6.856) 11.283,-7.728 11.283,-7.369 cw(c10.518,-6.468) 10.681,-7.638 cw(c10.863,-6.218) 10.136,-7.452 ccw(c9.39,-8.925) 9.528,-7.279 ccw(c9.643,-8.283) 8.949,-7.549 8.949,-7.908 ; 14.619,-7.481 15.965,-7.481 15.965,-7.122 14.619,-7.122 14.619,-7.481
  text ".Designator" at 3.3,-10.8 h2.2
  text "+" at -3.075,-1.075 h3
3D body "GBU8X_LESTER_12V-400W_H.STEP": height 1.21, standoff -9.87, extent -3.5,-22.88 18.8,0.32

## GBU8X_LESTER_24V-350W_H [mm]
height 20
pads (4):
  oval 2.55x3.4 hole 1.6: 1(0,0) 2(5.08,0) 3(10.16,0) 4(15.24,0)
TopOverlay:
  lines w0.2: -3.6,-2.35 -3.6,2.05 18.8,2.05 18.8,-2.35 -3.6,-2.35
  text "+" at -3.075,-1.075 h3
2-TopCompOutl:
  lines w0.1: -0.626,-4.856 -0.626,-2.806 -0.309,-2.806 ; -0.309,-3.561 0.326,-3.561 ; -0.309,-3.556 -0.309,-2.056 0.326,-2.056 0.326,-3.556 ; -0.309,-3.336 -0.309,-2.306 ; -0.309,-3.056 -0.309,-2.586 0.326,-2.586 0.326,-3.056 ; 0.326,-3.336 0.326,-2.306 ; 0.326,-2.806 0.644,-2.806 0.644,-4.856 ; 4.454,-4.856 4.454,-2.806 4.771,-2.806 ; 4.766,-3.561 5.401,-3.561 ; 4.771,-3.556 4.771,-2.056 5.406,-2.056 5.406,-3.556 ; 4.771,-3.336 4.771,-2.306 ; 4.771,-3.056 4.771,-2.586 5.406,-2.586 5.406,-3.056 ; 5.406,-3.336 5.406,-2.306 ; 5.406,-2.806 5.724,-2.806 5.724,-4.856 ; 9.534,-4.856 9.534,-2.806 9.851,-2.806 ; 9.851,-3.556 9.851,-2.056 10.486,-2.056 10.486,-3.556 ; 9.851,-3.336 9.851,-2.306 ; 9.851,-3.056 9.851,-2.586 10.486,-2.586 10.486,-3.056 ; 9.866,-3.561 10.501,-3.561 ; 10.486,-3.336 10.486,-2.306 ; 10.486,-2.806 10.804,-2.806 10.804,-4.856 ; 14.614,-4.856 14.614,-2.806 14.931,-2.806 ; 14.931,-3.556 14.931,-2.056 15.566,-2.056 15.566,-3.556 ; 14.931,-3.336 14.931,-2.306 ; 14.931,-3.056 14.931,-2.586 15.566,-2.586 15.566,-3.056 ; 14.941,-3.586 15.576,-3.586 ; 15.566,-3.336 15.566,-2.306 ; 15.566,-2.806 15.884,-2.806 15.884,-4.856 ; -0.309,-2.306 -0.309,-0.663 ; -0.309,-2.306 0.326,-2.306 ; -0.309,-0.663 -0.309,0.367 0.326,0.367 0.326,-0.663 ; -0.309,-0.663 0.326,-0.663 ; 0.326,-2.306 0.326,-0.663 ; 4.771,-2.306 4.771,-0.663 ; 4.771,-2.306 5.406,-2.306 ; 4.771,-0.663 4.771,0.367 5.406,0.367 5.406,-0.663 ; 4.771,-0.663 5.406,-0.663 ; 5.406,-2.306 5.406,-0.663 ; 9.851,-2.306 10.486,-2.306 ; 9.851,-2.306 9.851,-0.663 ; 9.851,-0.663 10.486,-0.663 ; 9.851,-0.663 9.851,0.367 10.486,0.367 10.486,-0.663 ; 10.486,-2.306 10.486,-0.663 ; 14.931,-2.306 15.566,-2.306 ; 14.931,-2.306 14.931,-0.663 ; 14.931,-0.663 15.566,-0.663 ; 14.931,-0.663 14.931,0.367 15.566,0.367 15.566,-0.663 ; 15.566,-2.306 15.566,-0.663 ; -3.521,-19.156 -3.521,-4.856 18.779,-4.856 18.779,-23.656 0.979,-23.656 -3.521,-19.156 ; -1.162,-7.84 -1.162,-7.526 -0.13,-7.526 -0.13,-6.494 0.184,-6.494 0.184,-7.526 1.216,-7.526 1.216,-7.84 0.184,-7.84 0.184,-8.872 -0.13,-8.872 -0.13,-7.84 -1.162,-7.84 ; 3.34,-7.908 cw(c4.106,-8.8) 3.924,-7.638 cw(c3.795,-8.955) 4.475,-7.82 ccw(c5.229,-6.36) 5.09,-7.997 ccw(c4.917,-6.856) 5.674,-7.728 5.674,-7.369 cw(c4.909,-6.468) 5.072,-7.638 cw(c5.254,-6.218) 4.527,-7.452 ccw(c3.781,-8.925) 3.919,-7.279 ccw(c4.034,-8.283) 3.34,-7.549 3.34,-7.908 ; 5.729,-15.756 ccw(c7.629,-15.756) 9.529,-15.756 9.529,-13.656 ccw(c7.629,-13.656) 5.729,-13.656 5.729,-15.756 ; 8.949,-7.908 cw(c9.715,-8.8) 9.533,-7.638 cw(c9.404,-8.955) 10.084,-7.82 ccw(c10.838,-6.36) 10.699,-7.997 ccw(c10.526,-6.856) 11.283,-7.728 11.283,-7.369 cw(c10.518,-6.468) 10.681,-7.638 cw(c10.863,-6.218) 10.136,-7.452 ccw(c9.39,-8.925) 9.528,-7.279 ccw(c9.643,-8.283) 8.949,-7.549 8.949,-7.908 ; 14.619,-7.481 14.619,-7.122 15.965,-7.122 15.965,-7.481 14.619,-7.481
4-TopCourty:
  circle w0.1: c-0.1,-0.05 r0.35
  lines w0.05: -3.85,-2.6 19.05,-2.6 19.05,2.1 -3.85,2.1 -3.85,-2.6
  lines w0.1: -0.625,-0.05 0.425,-0.05 ; -0.1,-0.575 -0.1,0.475
5-MCadOutl:
  lines w0.3: -5.3,-2.35 22.25,-2.35
  text "PCB EDGE" at 1.15,-4.3 h2
7-TopAssy:
  lines w0.1: -0.626,-4.856 -0.626,-2.806 -0.309,-2.806 ; -0.309,-3.561 0.326,-3.561 ; -0.309,-3.556 -0.309,-2.056 0.326,-2.056 0.326,-3.556 ; -0.309,-3.336 -0.309,-2.306 ; -0.309,-3.056 -0.309,-2.586 0.326,-2.586 0.326,-3.056 ; 0.326,-3.336 0.326,-2.306 ; 0.326,-2.806 0.644,-2.806 0.644,-4.856 ; 4.454,-4.856 4.454,-2.806 4.771,-2.806 ; 4.766,-3.561 5.401,-3.561 ; 4.771,-3.556 4.771,-2.056 5.406,-2.056 5.406,-3.556 ; 4.771,-3.336 4.771,-2.306 ; 4.771,-3.056 4.771,-2.586 5.406,-2.586 5.406,-3.056 ; 5.406,-3.336 5.406,-2.306 ; 5.406,-2.806 5.724,-2.806 5.724,-4.856 ; 9.534,-4.856 9.534,-2.806 9.851,-2.806 ; 9.851,-3.556 9.851,-2.056 10.486,-2.056 10.486,-3.556 ; 9.851,-3.336 9.851,-2.306 ; 9.851,-3.056 9.851,-2.586 10.486,-2.586 10.486,-3.056 ; 9.866,-3.561 10.501,-3.561 ; 10.486,-3.336 10.486,-2.306 ; 10.486,-2.806 10.804,-2.806 10.804,-4.856 ; 14.614,-4.856 14.614,-2.806 14.931,-2.806 ; 14.931,-3.556 14.931,-2.056 15.566,-2.056 15.566,-3.556 ; 14.931,-3.336 14.931,-2.306 ; 14.931,-3.056 14.931,-2.586 15.566,-2.586 15.566,-3.056 ; 14.941,-3.586 15.576,-3.586 ; 15.566,-3.336 15.566,-2.306 ; 15.566,-2.806 15.884,-2.806 15.884,-4.856 ; -0.309,-2.306 -0.309,-0.663 ; -0.309,-2.306 0.326,-2.306 ; -0.309,-0.663 -0.309,0.367 0.326,0.367 0.326,-0.663 ; -0.309,-0.663 0.326,-0.663 ; 0.326,-2.306 0.326,-0.663 ; 4.771,-2.306 4.771,-0.663 ; 4.771,-2.306 5.406,-2.306 ; 4.771,-0.663 4.771,0.367 5.406,0.367 5.406,-0.663 ; 4.771,-0.663 5.406,-0.663 ; 5.406,-2.306 5.406,-0.663 ; 9.851,-2.306 10.486,-2.306 ; 9.851,-2.306 9.851,-0.663 ; 9.851,-0.663 10.486,-0.663 ; 9.851,-0.663 9.851,0.367 10.486,0.367 10.486,-0.663 ; 10.486,-2.306 10.486,-0.663 ; 14.931,-2.306 15.566,-2.306 ; 14.931,-2.306 14.931,-0.663 ; 14.931,-0.663 15.566,-0.663 ; 14.931,-0.663 14.931,0.367 15.566,0.367 15.566,-0.663 ; 15.566,-2.306 15.566,-0.663 ; -3.521,-19.156 -3.521,-4.856 18.779,-4.856 18.779,-23.656 0.979,-23.656 -3.521,-19.156 ; -1.162,-7.84 -1.162,-7.526 -0.13,-7.526 -0.13,-6.494 0.184,-6.494 0.184,-7.526 1.216,-7.526 1.216,-7.84 0.184,-7.84 0.184,-8.872 -0.13,-8.872 -0.13,-7.84 -1.162,-7.84 ; 3.34,-7.908 cw(c4.106,-8.8) 3.924,-7.638 cw(c3.795,-8.955) 4.475,-7.82 ccw(c5.229,-6.36) 5.09,-7.997 ccw(c4.917,-6.856) 5.674,-7.728 5.674,-7.369 cw(c4.909,-6.468) 5.072,-7.638 cw(c5.254,-6.218) 4.527,-7.452 ccw(c3.781,-8.925) 3.919,-7.279 ccw(c4.034,-8.283) 3.34,-7.549 3.34,-7.908 ; 5.729,-15.756 ccw(c7.629,-15.756) 9.529,-15.756 9.529,-13.656 ccw(c7.629,-13.656) 5.729,-13.656 5.729,-15.756 ; 8.949,-7.908 cw(c9.715,-8.8) 9.533,-7.638 cw(c9.404,-8.955) 10.084,-7.82 ccw(c10.838,-6.36) 10.699,-7.997 ccw(c10.526,-6.856) 11.283,-7.728 11.283,-7.369 cw(c10.518,-6.468) 10.681,-7.638 cw(c10.863,-6.218) 10.136,-7.452 ccw(c9.39,-8.925) 9.528,-7.279 ccw(c9.643,-8.283) 8.949,-7.549 8.949,-7.908 ; 14.619,-7.481 14.619,-7.122 15.965,-7.122 15.965,-7.481 14.619,-7.481
  text "+" at -3.075,-1.075 h3
  text ".Designator" at 3.3,-10.8 h2.2
3D body "GBU8X_LESTER_24V-350W_H.STEP": height 0.97, standoff -7.96, extent -3.5,-23.19 18.8,0.39